# Altium footprint library Connectors_THT.PcbLib: 103 footprints (part 8 of 11)
Each footprint in its own frame and in the unit in brackets; x right, y up, seen from the top. Pads: shape width x height; smd on the part's side, far side on the other; paste and mask are expansions set on the pad; w line width, h text height; cw(c..) or ccw(c..) is an arc to the next point about the centre after c.
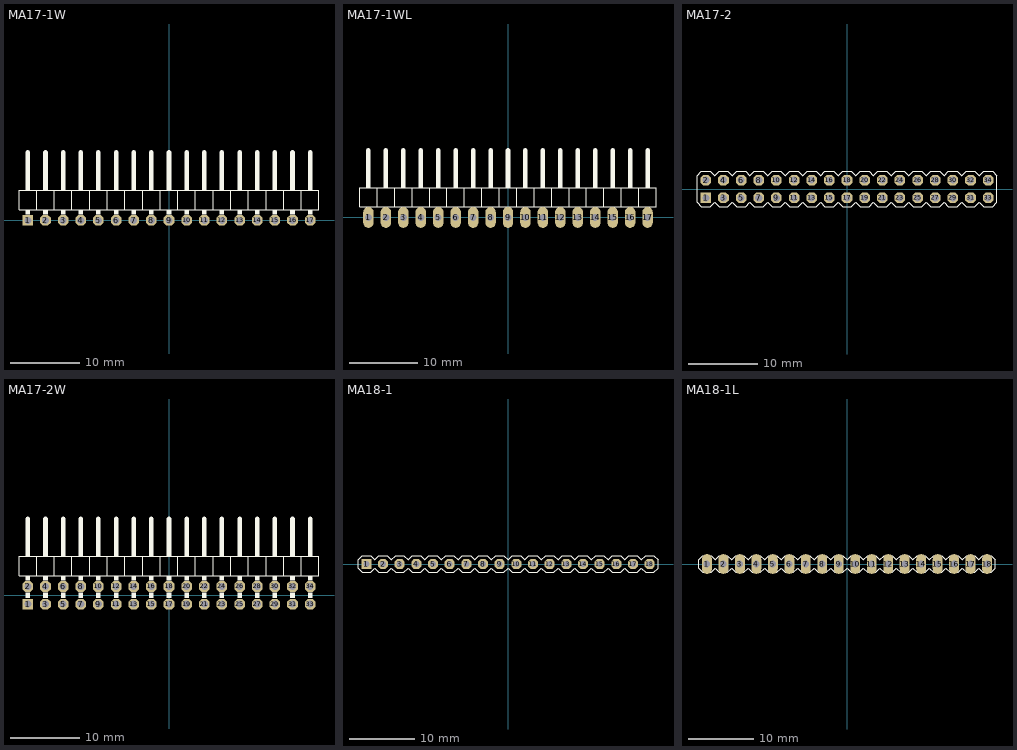
[diagram p7: the footprints below, top view; thin cyan lines are the x and y axes]

## MA17-1W [mil]
pads (17):
  rect 60x60 hole 40: 1(-800,0)
  oct 60x60 hole 40: 2(-700,0) 3(-600,0) 4(-500,0) 5(-400,0) 6(-300,0) 7(-200,0) 8(-100,0) 9(0,0) 10(100,0) 11(200,0) 12(300,0) 13(400,0) 14(500,0) 15(600,0) 16(700,0) 17(800,0)
Top Overlay:
  rectangle: 687,170 713,200
  rectangle: 787,170 813,200
  rectangle: 187,170 213,200
  rectangle: 287,170 313,200
  rectangle: 387,170 413,200
  rectangle: 487,170 513,200
  rectangle: 587,170 613,200
  rectangle: -313,170 -287,200
  rectangle: -213,170 -187,200
  rectangle: -113,170 -87,200
  rectangle: -13,170 13,200
  rectangle: 87,170 113,200
  rectangle: -813,170 -787,200
  rectangle: -713,170 -687,200
  rectangle: -613,170 -587,200
  rectangle: -513,170 -487,200
  rectangle: -413,170 -387,200
  rectangle: 787,34 813,60
  rectangle: 687,34 713,60
  rectangle: 587,34 613,60
  rectangle: 487,34 513,60
  rectangle: 387,34 413,60
  rectangle: 287,34 313,60
  rectangle: 187,34 213,60
  rectangle: 87,34 113,60
  rectangle: -13,34 13,60
  rectangle: -113,34 -87,60
  rectangle: -213,34 -187,60
  rectangle: -313,34 -287,60
  rectangle: -413,34 -387,60
  rectangle: -513,34 -487,60
  rectangle: -613,34 -587,60
  rectangle: -713,34 -687,60
  rectangle: -813,34 -787,60
  lines w6: -750,60 -750,170 ; -750,60 -850,60 -850,170 -750,170 ; -750,60 -650,60 ; -750,170 -650,170 ; -650,60 -550,60 ; -650,60 -650,170 ; -650,170 -550,170 ; -550,60 -450,60 ; -550,60 -550,170 ; -550,170 -450,170 ; -450,60 -350,60 ; -450,60 -450,170 ; -450,170 -350,170 ; -350,60 -250,60 ; -350,60 -350,170 ; -350,170 -250,170 ; -250,60 -250,170 ; -250,60 -150,60 ; -250,170 -150,170 ; -150,60 -50,60 ; -150,60 -150,170 ; -150,170 -50,170 ; -50,60 50,60 ; -50,60 -50,170 ; -50,170 50,170 ; 50,60 150,60 ; 50,60 50,170 ; 50,170 150,170 ; 150,60 250,60 ; 150,60 150,170 ; 150,170 250,170 ; 250,60 250,170 ; 250,60 350,60 ; 250,170 350,170 ; 350,60 450,60 ; 350,60 350,170 ; 350,170 450,170 ; 450,60 550,60 ; 450,60 450,170 ; 450,170 550,170 ; 550,60 650,60 ; 550,60 550,170 ; 550,170 650,170 ; 650,60 750,60 ; 650,60 650,170 ; 650,170 750,170 ; 750,60 750,170 ; 750,60 850,60 850,170 750,170
  lines w26: -800,200 -800,385 ; -700,200 -700,385 ; -600,200 -600,385 ; -500,200 -500,385 ; -400,200 -400,385 ; -300,200 -300,385 ; -200,200 -200,385 ; -100,200 -100,385 ; 0,200 0,385 ; 100,200 100,385 ; 200,200 200,385 ; 300,200 300,385 ; 400,200 400,385 ; 500,200 500,385 ; 600,200 600,385 ; 700,200 700,385 ; 800,200 800,385
3D body: height 62.48, standoff 0, extent 787.51,-12.49 812.51,12.51
3D body: height 100, standoff 0, extent 750,60 850,170
3D body: height 62.5, standoff 37.5, extent 787.51,-12.49 812.51,393.76
3D body: height 62.5, standoff 37.5, extent 687.5,-12.49 712.5,393.75
3D body: height 100, standoff 0, extent 650,60 750,170
3D body: height 62.48, standoff 0, extent 687.51,-12.49 712.51,12.51
3D body: height 31.5, standoff 0, extent 687.51,-12.49 712.51,12.51
3D body: height 31.5, standoff 0, extent 787.51,-12.49 812.51,12.51
3D body: height 62.48, standoff 0, extent 587.51,-12.49 612.51,12.51
3D body: height 100, standoff 0, extent 550,60 650,170
3D body: height 62.5, standoff 37.5, extent 587.51,-12.49 612.51,393.76
3D body: height 62.48, standoff 0, extent 487.51,-12.49 512.51,12.51
3D body: height 100, standoff 0, extent 450,60 550,170
3D body: height 62.5, standoff 37.5, extent 487.51,-12.49 512.51,393.76
3D body: height 62.48, standoff 0, extent 387.51,-12.49 412.51,12.51
3D body: height 100, standoff 0, extent 350,60 450,170
3D body: height 62.5, standoff 37.5, extent 387.51,-12.49 412.51,393.76
3D body: height 62.48, standoff 0, extent 287.51,-12.49 312.51,12.51
3D body: height 100, standoff 0, extent 250,60 350,170
3D body: height 62.5, standoff 37.5, extent 287.51,-12.49 312.51,393.76
3D body: height 62.5, standoff 37.5, extent 187.5,-12.49 212.5,393.75
3D body: height 100, standoff 0, extent 150,60 250,170
3D body: height 62.48, standoff 0, extent 187.51,-12.49 212.51,12.51
3D body: height 31.5, standoff 0, extent 187.51,-12.49 212.51,12.51
3D body: height 31.5, standoff 0, extent 287.51,-12.49 312.51,12.51
3D body: height 31.5, standoff 0, extent 387.51,-12.49 412.51,12.51
3D body: height 31.5, standoff 0, extent 487.51,-12.49 512.51,12.51
3D body: height 31.5, standoff 0, extent 587.51,-12.49 612.51,12.51
3D body: height 62.48, standoff 0, extent 87.51,-12.49 112.51,12.51
3D body: height 100, standoff 0, extent 50,60 150,170
3D body: height 62.5, standoff 37.5, extent 87.51,-12.49 112.51,393.76
3D body: height 62.48, standoff 0, extent -12.49,-12.49 12.51,12.51
3D body: height 100, standoff 0, extent -50,60 50,170
3D body: height 62.5, standoff 37.5, extent -12.49,-12.49 12.51,393.76
3D body: height 62.48, standoff 0, extent -112.49,-12.49 -87.49,12.51
3D body: height 100, standoff 0, extent -150,60 -50,170
3D body: height 62.5, standoff 37.5, extent -112.49,-12.49 -87.49,393.76
3D body: height 62.48, standoff 0, extent -212.49,-12.49 -187.49,12.51
3D body: height 100, standoff 0, extent -250,60 -150,170
3D body: height 62.5, standoff 37.5, extent -212.49,-12.49 -187.49,393.76
3D body: height 62.5, standoff 37.5, extent -312.5,-12.49 -287.5,393.75
3D body: height 100, standoff 0, extent -350,60 -250,170
3D body: height 62.48, standoff 0, extent -312.49,-12.49 -287.49,12.51
3D body: height 31.5, standoff 0, extent -312.49,-12.49 -287.49,12.51
3D body: height 31.5, standoff 0, extent -212.49,-12.49 -187.49,12.51
3D body: height 31.5, standoff 0, extent -112.49,-12.49 -87.49,12.51
3D body: height 31.5, standoff 0, extent -12.49,-12.49 12.51,12.51
3D body: height 31.5, standoff 0, extent 87.51,-12.49 112.51,12.51
3D body: height 62.48, standoff 0, extent -412.49,-12.49 -387.49,12.51
3D body: height 100, standoff 0, extent -450,60 -350,170
3D body: height 62.5, standoff 37.5, extent -412.49,-12.49 -387.49,393.76
3D body: height 62.48, standoff 0, extent -512.49,-12.49 -487.49,12.51
3D body: height 100, standoff 0, extent -550,60 -450,170
3D body: height 62.5, standoff 37.5, extent -512.49,-12.49 -487.49,393.76
3D body: height 62.48, standoff 0, extent -612.49,-12.49 -587.49,12.51
3D body: height 100, standoff 0, extent -650,60 -550,170
3D body: height 62.5, standoff 37.5, extent -612.49,-12.49 -587.49,393.76
3D body: height 62.48, standoff 0, extent -712.49,-12.49 -687.49,12.51
3D body: height 100, standoff 0, extent -750,60 -650,170
3D body: height 62.5, standoff 37.5, extent -712.49,-12.49 -687.49,393.76
3D body: height 62.5, standoff 37.5, extent -812.5,-12.49 -787.5,393.75
3D body: height 100, standoff 0, extent -850,60 -750,170
3D body: height 62.48, standoff 0, extent -812.49,-12.49 -787.49,12.51
3D body: height 31.5, standoff 0, extent -812.49,-12.49 -787.49,12.51
3D body: height 31.5, standoff 0, extent -712.49,-12.49 -687.49,12.51
3D body: height 31.5, standoff 0, extent -612.49,-12.49 -587.49,12.51
3D body: height 31.5, standoff 0, extent -512.49,-12.49 -487.49,12.51
3D body: height 31.5, standoff 0, extent -412.49,-12.49 -387.49,12.51

## MA17-1WL [mil]
pads (17):
  oval 60x120 hole 40: 1(-800,0) 2(-700,0) 3(-600,0) 4(-500,0) 5(-400,0) 6(-300,0) 7(-200,0) 8(-100,0) 9(0,0) 10(100,0) 11(200,0) 12(300,0) 13(400,0) 14(500,0) 15(600,0) 16(700,0) 17(800,0)
Top Overlay:
  rectangle: -813,34 -787,60
  rectangle: -713,34 -687,60
  rectangle: -613,34 -587,60
  rectangle: -513,34 -487,60
  rectangle: -413,34 -387,60
  rectangle: -313,34 -287,60
  rectangle: -213,34 -187,60
  rectangle: -113,34 -87,60
  rectangle: -13,34 13,60
  rectangle: 87,34 113,60
  rectangle: 187,34 213,60
  rectangle: 287,34 313,60
  rectangle: 387,34 413,60
  rectangle: 487,34 513,60
  rectangle: 587,34 613,60
  rectangle: 687,34 713,60
  rectangle: 787,34 813,60
  rectangle: -413,170 -387,200
  rectangle: -513,170 -487,200
  rectangle: -613,170 -587,200
  rectangle: -713,170 -687,200
  rectangle: -813,170 -787,200
  rectangle: 87,170 113,200
  rectangle: -13,170 13,200
  rectangle: -113,170 -87,200
  rectangle: -213,170 -187,200
  rectangle: -313,170 -287,200
  rectangle: 587,170 613,200
  rectangle: 487,170 513,200
  rectangle: 387,170 413,200
  rectangle: 287,170 313,200
  rectangle: 187,170 213,200
  rectangle: 787,170 813,200
  rectangle: 687,170 713,200
  lines w6: -750,60 -650,60 ; -750,60 -850,60 -850,170 -750,170 ; -750,60 -750,170 ; -750,170 -650,170 ; -650,60 -650,170 ; -650,60 -550,60 ; -650,170 -550,170 ; -550,60 -550,170 ; -550,60 -450,60 ; -550,170 -450,170 ; -450,60 -450,170 ; -450,60 -350,60 ; -450,170 -350,170 ; -350,60 -350,170 ; -350,60 -250,60 ; -350,170 -250,170 ; -250,60 -150,60 ; -250,60 -250,170 ; -250,170 -150,170 ; -150,60 -150,170 ; -150,60 -50,60 ; -150,170 -50,170 ; -50,60 -50,170 ; -50,60 50,60 ; -50,170 50,170 ; 50,60 50,170 ; 50,60 150,60 ; 50,170 150,170 ; 150,60 150,170 ; 150,60 250,60 ; 150,170 250,170 ; 250,60 350,60 ; 250,60 250,170 ; 250,170 350,170 ; 350,60 350,170 ; 350,60 450,60 ; 350,170 450,170 ; 450,60 450,170 ; 450,60 550,60 ; 450,170 550,170 ; 550,60 550,170 ; 550,60 650,60 ; 550,170 650,170 ; 650,60 650,170 ; 650,60 750,60 ; 650,170 750,170 ; 750,60 850,60 850,170 750,170 ; 750,60 750,170
  lines w26: -800,200 -800,385 ; -700,200 -700,385 ; -600,200 -600,385 ; -500,200 -500,385 ; -400,200 -400,385 ; -300,200 -300,385 ; -200,200 -200,385 ; -100,200 -100,385 ; 0,200 0,385 ; 100,200 100,385 ; 200,200 200,385 ; 300,200 300,385 ; 400,200 400,385 ; 500,200 500,385 ; 600,200 600,385 ; 700,200 700,385 ; 800,200 800,385
3D body: height 31.5, standoff 0, extent -412.49,-12.49 -387.49,12.51
3D body: height 31.5, standoff 0, extent -512.49,-12.49 -487.49,12.51
3D body: height 31.5, standoff 0, extent -612.49,-12.49 -587.49,12.51
3D body: height 31.5, standoff 0, extent -712.49,-12.49 -687.49,12.51
3D body: height 31.5, standoff 0, extent -812.49,-12.49 -787.49,12.51
3D body: height 62.48, standoff 0, extent -812.49,-12.49 -787.49,12.51
3D body: height 100, standoff 0, extent -850,60 -750,170
3D body: height 62.5, standoff 37.5, extent -812.5,-12.49 -787.5,393.75
3D body: height 62.5, standoff 37.5, extent -712.49,-12.49 -687.49,393.76
3D body: height 100, standoff 0, extent -750,60 -650,170
3D body: height 62.48, standoff 0, extent -712.49,-12.49 -687.49,12.51
3D body: height 62.5, standoff 37.5, extent -612.49,-12.49 -587.49,393.76
3D body: height 100, standoff 0, extent -650,60 -550,170
3D body: height 62.48, standoff 0, extent -612.49,-12.49 -587.49,12.51
3D body: height 62.5, standoff 37.5, extent -512.49,-12.49 -487.49,393.76
3D body: height 100, standoff 0, extent -550,60 -450,170
3D body: height 62.48, standoff 0, extent -512.49,-12.49 -487.49,12.51
3D body: height 62.5, standoff 37.5, extent -412.49,-12.49 -387.49,393.76
3D body: height 100, standoff 0, extent -450,60 -350,170
3D body: height 62.48, standoff 0, extent -412.49,-12.49 -387.49,12.51
3D body: height 31.5, standoff 0, extent 87.51,-12.49 112.51,12.51
3D body: height 31.5, standoff 0, extent -12.49,-12.49 12.51,12.51
3D body: height 31.5, standoff 0, extent -112.49,-12.49 -87.49,12.51
3D body: height 31.5, standoff 0, extent -212.49,-12.49 -187.49,12.51
3D body: height 31.5, standoff 0, extent -312.49,-12.49 -287.49,12.51
3D body: height 62.48, standoff 0, extent -312.49,-12.49 -287.49,12.51
3D body: height 100, standoff 0, extent -350,60 -250,170
3D body: height 62.5, standoff 37.5, extent -312.5,-12.49 -287.5,393.75
3D body: height 62.5, standoff 37.5, extent -212.49,-12.49 -187.49,393.76
3D body: height 100, standoff 0, extent -250,60 -150,170
3D body: height 62.48, standoff 0, extent -212.49,-12.49 -187.49,12.51
3D body: height 62.5, standoff 37.5, extent -112.49,-12.49 -87.49,393.76
3D body: height 100, standoff 0, extent -150,60 -50,170
3D body: height 62.48, standoff 0, extent -112.49,-12.49 -87.49,12.51
3D body: height 62.5, standoff 37.5, extent -12.49,-12.49 12.51,393.76
3D body: height 100, standoff 0, extent -50,60 50,170
3D body: height 62.48, standoff 0, extent -12.49,-12.49 12.51,12.51
3D body: height 62.5, standoff 37.5, extent 87.51,-12.49 112.51,393.76
3D body: height 100, standoff 0, extent 50,60 150,170
3D body: height 62.48, standoff 0, extent 87.51,-12.49 112.51,12.51
3D body: height 31.5, standoff 0, extent 587.51,-12.49 612.51,12.51
3D body: height 31.5, standoff 0, extent 487.51,-12.49 512.51,12.51
3D body: height 31.5, standoff 0, extent 387.51,-12.49 412.51,12.51
3D body: height 31.5, standoff 0, extent 287.51,-12.49 312.51,12.51
3D body: height 31.5, standoff 0, extent 187.51,-12.49 212.51,12.51
3D body: height 62.48, standoff 0, extent 187.51,-12.49 212.51,12.51
3D body: height 100, standoff 0, extent 150,60 250,170
3D body: height 62.5, standoff 37.5, extent 187.5,-12.49 212.5,393.75
3D body: height 62.5, standoff 37.5, extent 287.51,-12.49 312.51,393.76
3D body: height 100, standoff 0, extent 250,60 350,170
3D body: height 62.48, standoff 0, extent 287.51,-12.49 312.51,12.51
3D body: height 62.5, standoff 37.5, extent 387.51,-12.49 412.51,393.76
3D body: height 100, standoff 0, extent 350,60 450,170
3D body: height 62.48, standoff 0, extent 387.51,-12.49 412.51,12.51
3D body: height 62.5, standoff 37.5, extent 487.51,-12.49 512.51,393.76
3D body: height 100, standoff 0, extent 450,60 550,170
3D body: height 62.48, standoff 0, extent 487.51,-12.49 512.51,12.51
3D body: height 62.5, standoff 37.5, extent 587.51,-12.49 612.51,393.76
3D body: height 100, standoff 0, extent 550,60 650,170
3D body: height 62.48, standoff 0, extent 587.51,-12.49 612.51,12.51
3D body: height 31.5, standoff 0, extent 787.51,-12.49 812.51,12.51
3D body: height 31.5, standoff 0, extent 687.51,-12.49 712.51,12.51
3D body: height 62.48, standoff 0, extent 687.51,-12.49 712.51,12.51
3D body: height 100, standoff 0, extent 650,60 750,170
3D body: height 62.5, standoff 37.5, extent 687.5,-12.49 712.5,393.75
3D body: height 62.5, standoff 37.5, extent 787.51,-12.49 812.51,393.76
3D body: height 100, standoff 0, extent 750,60 850,170
3D body: height 62.48, standoff 0, extent 787.51,-12.49 812.51,12.51

## MA17-2 [mil]
pads (34):
  rect 60x60 hole 40: 1(-800,-50)
  oct 60x60 hole 40: 2(-800,50) 3(-700,-50) 4(-700,50) 5(-600,-50) 6(-600,50) 7(-500,-50) 8(-500,50) 9(-400,-50) 10(-400,50) 11(-300,-50) 12(-300,50) 13(-200,-50) 14(-200,50) 15(-100,-50) 16(-100,50) 17(0,-50) 18(0,50) 19(100,-50) 20(100,50) 21(200,-50) 22(200,50) 23(300,-50) 24(300,50) 25(400,-50) 26(400,50) 27(500,-50) 28(500,50) 29(600,-50) 30(600,50) 31(700,-50) 32(700,50) 33(800,-50) 34(800,50)
Top Overlay:
  lines w6: -850,-75 -825,-100 -775,-100 -750,-75 -725,-100 -675,-100 -650,-75 -625,-100 -575,-100 -550,-75 -525,-100 -475,-100 -450,-75 -425,-100 -375,-100 -350,-75 -325,-100 -275,-100 -250,-75 -225,-100 -175,-100 -150,-75 -125,-100 -75,-100 -50,-75 -25,-100 25,-100 50,-75 75,-100 125,-100 150,-75 175,-100 225,-100 250,-75 275,-100 325,-100 350,-75 375,-100 425,-100 450,-75 475,-100 525,-100 550,-75 575,-100 625,-100 650,-75 675,-100 725,-100 750,-75 775,-100 825,-100 850,-75 850,75 825,100 775,100 750,75 725,100 675,100 650,75 625,100 575,100 550,75 525,100 475,100 450,75 425,100 375,100 350,75 325,100 275,100 250,75 225,100 175,100 150,75 125,100 75,100 50,75 25,100 -25,100 -50,75 -75,100 -125,100 -150,75 -175,100 -225,100 -250,75 -275,100 -325,100 -350,75 -375,100 -425,100 -450,75 -475,100 -525,100 -550,75 -575,100 -625,100 -650,75 -675,100 -725,100 -750,75 -775,100 -825,100 -850,75 -850,-75
3D body: height 31.5, standoff 0, extent 587.51,-62.49 612.51,-37.49
3D body: height 338.58, standoff 0, extent 587.51,37.51 612.51,62.51
3D body: height 98.43, standoff 11.81, extent 550,-100 650,100
3D body: height 11.81, standoff 0, extent 550,75 650,100
3D body: height 11.81, standoff 0, extent 550,-100 650,-75
3D body: height 338.58, standoff 0, extent 587.51,-62.49 612.51,-37.49
3D body: height 31.5, standoff 0, extent 587.51,37.51 612.51,62.51
3D body: height 31.5, standoff 0, extent 687.51,-62.49 712.51,-37.49
3D body: height 338.58, standoff 0, extent 687.51,37.51 712.51,62.51
3D body: height 98.43, standoff 11.81, extent 650,-100 750,100
3D body: height 11.81, standoff 0, extent 650,75 750,100
3D body: height 11.81, standoff 0, extent 650,-100 750,-75
3D body: height 338.58, standoff 0, extent 687.51,-62.49 712.51,-37.49
3D body: height 31.5, standoff 0, extent 687.51,37.51 712.51,62.51
3D body: height 31.5, standoff 0, extent 787.51,-62.49 812.51,-37.49
3D body: height 338.58, standoff 0, extent 787.51,37.51 812.51,62.51
3D body: height 98.43, standoff 11.81, extent 750,-100 850,100
3D body: height 11.81, standoff 0, extent 750,75 850,100
3D body: height 11.81, standoff 0, extent 750,-100 850,-75
3D body: height 338.58, standoff 0, extent 787.51,-62.49 812.51,-37.49
3D body: height 31.5, standoff 0, extent 787.51,37.51 812.51,62.51
3D body: height 31.5, standoff 0, extent -112.49,-62.49 -87.49,-37.49
3D body: height 338.58, standoff 0, extent -112.49,37.51 -87.49,62.51
3D body: height 98.43, standoff 11.81, extent -150,-100 -50,100
3D body: height 11.81, standoff 0, extent -150,75 -50,100
3D body: height 11.81, standoff 0, extent -150,-100 -50,-75
3D body: height 338.58, standoff 0, extent -112.49,-62.49 -87.49,-37.49
3D body: height 31.5, standoff 0, extent -112.49,37.51 -87.49,62.51
3D body: height 31.5, standoff 0, extent -12.49,-62.49 12.51,-37.49
3D body: height 338.58, standoff 0, extent -12.49,37.51 12.51,62.51
3D body: height 98.43, standoff 11.81, extent -50,-100 50,100
3D body: height 11.81, standoff 0, extent -50,75 50,100
3D body: height 11.81, standoff 0, extent -50,-100 50,-75
3D body: height 338.58, standoff 0, extent -12.49,-62.49 12.51,-37.49
3D body: height 31.5, standoff 0, extent -12.49,37.51 12.51,62.51
3D body: height 31.5, standoff 0, extent 87.51,-62.49 112.51,-37.49
3D body: height 338.58, standoff 0, extent 87.51,37.51 112.51,62.51
3D body: height 98.43, standoff 11.81, extent 50,-100 150,100
3D body: height 11.81, standoff 0, extent 50,75 150,100
3D body: height 11.81, standoff 0, extent 50,-100 150,-75
3D body: height 338.58, standoff 0, extent 87.51,-62.49 112.51,-37.49
3D body: height 31.5, standoff 0, extent 87.51,37.51 112.51,62.51
3D body: height 31.5, standoff 0, extent 187.51,-62.49 212.51,-37.49
3D body: height 338.58, standoff 0, extent 187.51,37.51 212.51,62.51
3D body: height 98.43, standoff 11.81, extent 150,-100 250,100
3D body: height 11.81, standoff 0, extent 150,75 250,100
3D body: height 11.81, standoff 0, extent 150,-100 250,-75
3D body: height 338.58, standoff 0, extent 187.51,-62.49 212.51,-37.49
3D body: height 31.5, standoff 0, extent 187.51,37.51 212.51,62.51
3D body: height 31.5, standoff 0, extent 287.51,-62.49 312.51,-37.49
3D body: height 338.58, standoff 0, extent 287.51,37.51 312.51,62.51
3D body: height 98.43, standoff 11.81, extent 250,-100 350,100
3D body: height 11.81, standoff 0, extent 250,75 350,100
3D body: height 11.81, standoff 0, extent 250,-100 350,-75
3D body: height 338.58, standoff 0, extent 287.51,-62.49 312.51,-37.49
3D body: height 31.5, standoff 0, extent 287.51,37.51 312.51,62.51
3D body: height 31.5, standoff 0, extent 387.51,-62.49 412.51,-37.49
3D body: height 338.58, standoff 0, extent 387.51,37.51 412.51,62.51
3D body: height 98.43, standoff 11.81, extent 350,-100 450,100
3D body: height 11.81, standoff 0, extent 350,75 450,100
3D body: height 11.81, standoff 0, extent 350,-100 450,-75
3D body: height 338.58, standoff 0, extent 387.51,-62.49 412.51,-37.49
3D body: height 31.5, standoff 0, extent 387.51,37.51 412.51,62.51
3D body: height 31.5, standoff 0, extent 487.51,-62.49 512.51,-37.49
3D body: height 338.58, standoff 0, extent 487.51,37.51 512.51,62.51
3D body: height 98.43, standoff 11.81, extent 450,-100 550,100
3D body: height 11.81, standoff 0, extent 450,75 550,100
3D body: height 11.81, standoff 0, extent 450,-100 550,-75
3D body: height 338.58, standoff 0, extent 487.51,-62.49 512.51,-37.49
3D body: height 31.5, standoff 0, extent 487.51,37.51 512.51,62.51
3D body: height 31.5, standoff 0, extent -812.49,-62.49 -787.49,-37.49
3D body: height 338.58, standoff 0, extent -812.49,37.51 -787.49,62.51
3D body: height 98.43, standoff 11.81, extent -850,-100 -750,100
3D body: height 11.81, standoff 0, extent -850,75 -750,100
3D body: height 11.81, standoff 0, extent -850,-100 -750,-75
3D body: height 338.58, standoff 0, extent -812.49,-62.49 -787.49,-37.49
3D body: height 31.5, standoff 0, extent -812.49,37.51 -787.49,62.51
3D body: height 31.5, standoff 0, extent -712.49,-62.49 -687.49,-37.49
3D body: height 338.58, standoff 0, extent -712.49,37.51 -687.49,62.51
3D body: height 98.43, standoff 11.81, extent -750,-100 -650,100
3D body: height 11.81, standoff 0, extent -750,75 -650,100
3D body: height 11.81, standoff 0, extent -750,-100 -650,-75
3D body: height 338.58, standoff 0, extent -712.49,-62.49 -687.49,-37.49
3D body: height 31.5, standoff 0, extent -712.49,37.51 -687.49,62.51
3D body: height 31.5, standoff 0, extent -612.49,-62.49 -587.49,-37.49
3D body: height 338.58, standoff 0, extent -612.49,37.51 -587.49,62.51
3D body: height 98.43, standoff 11.81, extent -650,-100 -550,100
3D body: height 11.81, standoff 0, extent -650,75 -550,100
3D body: height 11.81, standoff 0, extent -650,-100 -550,-75
3D body: height 338.58, standoff 0, extent -612.49,-62.49 -587.49,-37.49
3D body: height 31.5, standoff 0, extent -612.49,37.51 -587.49,62.51
3D body: height 31.5, standoff 0, extent -512.49,-62.49 -487.49,-37.49
3D body: height 338.58, standoff 0, extent -512.49,37.51 -487.49,62.51
3D body: height 98.43, standoff 11.81, extent -550,-100 -450,100
3D body: height 11.81, standoff 0, extent -550,75 -450,100
3D body: height 11.81, standoff 0, extent -550,-100 -450,-75
3D body: height 338.58, standoff 0, extent -512.49,-62.49 -487.49,-37.49
3D body: height 31.5, standoff 0, extent -512.49,37.51 -487.49,62.51
3D body: height 31.5, standoff 0, extent -412.49,-62.49 -387.49,-37.49
3D body: height 338.58, standoff 0, extent -412.49,37.51 -387.49,62.51
3D body: height 98.43, standoff 11.81, extent -450,-100 -350,100
3D body: height 11.81, standoff 0, extent -450,75 -350,100
3D body: height 11.81, standoff 0, extent -450,-100 -350,-75
3D body: height 338.58, standoff 0, extent -412.49,-62.49 -387.49,-37.49
3D body: height 31.5, standoff 0, extent -412.49,37.51 -387.49,62.51
3D body: height 31.5, standoff 0, extent -312.49,-62.49 -287.49,-37.49
3D body: height 338.58, standoff 0, extent -312.49,37.51 -287.49,62.51
3D body: height 98.43, standoff 11.81, extent -350,-100 -250,100
3D body: height 11.81, standoff 0, extent -350,75 -250,100
3D body: height 11.81, standoff 0, extent -350,-100 -250,-75
3D body: height 338.58, standoff 0, extent -312.49,-62.49 -287.49,-37.49
3D body: height 31.5, standoff 0, extent -312.49,37.51 -287.49,62.51
3D body: height 31.5, standoff 0, extent -212.49,-62.49 -187.49,-37.49
3D body: height 338.58, standoff 0, extent -212.49,37.51 -187.49,62.51
3D body: height 98.43, standoff 11.81, extent -250,-100 -150,100
3D body: height 11.81, standoff 0, extent -250,75 -150,100
3D body: height 11.81, standoff 0, extent -250,-100 -150,-75
3D body: height 338.58, standoff 0, extent -212.49,-62.49 -187.49,-37.49
3D body: height 31.5, standoff 0, extent -212.49,37.51 -187.49,62.51

## MA17-2W [mil]
pads (34):
  rect 60x60 hole 40: 1(-800,-50)
  oct 60x60 hole 40: 2(-800,50) 3(-700,-50) 4(-700,50) 5(-600,-50) 6(-600,50) 7(-500,-50) 8(-500,50) 9(-400,-50) 10(-400,50) 11(-300,-50) 12(-300,50) 13(-200,-50) 14(-200,50) 15(-100,-50) 16(-100,50) 17(0,-50) 18(0,50) 19(100,-50) 20(100,50) 21(200,-50) 22(200,50) 23(300,-50) 24(300,50) 25(400,-50) 26(400,50) 27(500,-50) 28(500,50) 29(600,-50) 30(600,50) 31(700,-50) 32(700,50) 33(800,-50) 34(800,50)
Top Overlay:
  rectangle: 687,220 713,250
  rectangle: 787,220 813,250
  rectangle: 187,220 213,250
  rectangle: 287,220 313,250
  rectangle: 387,220 413,250
  rectangle: 487,220 513,250
  rectangle: 587,220 613,250
  rectangle: -313,220 -287,250
  rectangle: -213,220 -187,250
  rectangle: -113,220 -87,250
  rectangle: -13,220 13,250
  rectangle: 87,220 113,250
  rectangle: -813,220 -787,250
  rectangle: -713,220 -687,250
  rectangle: -613,220 -587,250
  rectangle: -513,220 -487,250
  rectangle: -413,220 -387,250
  rectangle: 787,84 813,110
  rectangle: 687,84 713,110
  rectangle: 587,84 613,110
  rectangle: 487,84 513,110
  rectangle: 387,84 413,110
  rectangle: 287,84 313,110
  rectangle: 187,84 213,110
  rectangle: 87,84 113,110
  rectangle: -13,84 13,110
  rectangle: -113,84 -87,110
  rectangle: -213,84 -187,110
  rectangle: -313,84 -287,110
  rectangle: -413,84 -387,110
  rectangle: -513,84 -487,110
  rectangle: -613,84 -587,110
  rectangle: -713,84 -687,110
  rectangle: -813,84 -787,110
  rectangle: -813,-16 -787,16
  rectangle: -713,-16 -687,16
  rectangle: -613,-16 -587,16
  rectangle: -513,-16 -487,16
  rectangle: -413,-16 -387,16
  rectangle: -313,-16 -287,16
  rectangle: -213,-16 -187,16
  rectangle: -113,-16 -87,16
  rectangle: -13,-16 13,16
  rectangle: 87,-16 113,16
  rectangle: 187,-16 213,16
  rectangle: 287,-16 313,16
  rectangle: 387,-16 413,16
  rectangle: 487,-16 513,16
  rectangle: 587,-16 613,16
  rectangle: 687,-16 713,16
  rectangle: 787,-16 813,16
  lines w6: -750,110 -750,220 ; -750,110 -850,110 -850,220 -750,220 ; -750,110 -650,110 ; -750,220 -650,220 ; -650,110 -550,110 ; -650,110 -650,220 ; -650,220 -550,220 ; -550,110 -450,110 ; -550,110 -550,220 ; -550,220 -450,220 ; -450,110 -350,110 ; -450,110 -450,220 ; -450,220 -350,220 ; -350,110 -250,110 ; -350,110 -350,220 ; -350,220 -250,220 ; -250,110 -250,220 ; -250,110 -150,110 ; -250,220 -150,220 ; -150,110 -50,110 ; -150,110 -150,220 ; -150,220 -50,220 ; -50,110 50,110 ; -50,110 -50,220 ; -50,220 50,220 ; 50,110 150,110 ; 50,110 50,220 ; 50,220 150,220 ; 150,110 250,110 ; 150,110 150,220 ; 150,220 250,220 ; 250,110 250,220 ; 250,110 350,110 ; 250,220 350,220 ; 350,110 450,110 ; 350,110 350,220 ; 350,220 450,220 ; 450,110 550,110 ; 450,110 450,220 ; 450,220 550,220 ; 550,110 650,110 ; 550,110 550,220 ; 550,220 650,220 ; 650,110 750,110 ; 650,110 650,220 ; 650,220 750,220 ; 750,110 750,220 ; 750,110 850,110 850,220 750,220
  lines w26: -800,250 -800,435 ; -700,250 -700,435 ; -600,250 -600,435 ; -500,250 -500,435 ; -400,250 -400,435 ; -300,250 -300,435 ; -200,250 -200,435 ; -100,250 -100,435 ; 0,250 0,435 ; 100,250 100,435 ; 200,250 200,435 ; 300,250 300,435 ; 400,250 400,435 ; 500,250 500,435 ; 600,250 600,435 ; 700,250 700,435 ; 800,250 800,435
3D body: height 162.48, standoff 137.52, extent 787.5,-62.49 812.5,443.76
3D body: height 162.48, standoff 0, extent 787.51,-62.49 812.51,-37.49
3D body: height 62.48, standoff 0, extent 787.51,37.51 812.51,62.51
3D body: height 200, standoff 0, extent 750,110 850,220
3D body: height 62.5, standoff 37.5, extent 787.51,37.51 812.51,443.76
3D body: height 62.5, standoff 37.5, extent 687.5,37.51 712.5,443.75
3D body: height 200, standoff 0, extent 650,110 750,220
3D body: height 62.48, standoff 0, extent 687.51,37.51 712.51,62.51
3D body: height 162.48, standoff 0, extent 687.5,-62.5 712.5,-37.5
3D body: height 162.48, standoff 137.52, extent 687.5,-62.5 712.5,443.75
3D body: height 31.5, standoff 0, extent 687.51,37.5 712.51,62.5
3D body: height 31.5, standoff 0, extent 687.5,-62.5 712.5,-37.5
3D body: height 31.5, standoff 0, extent 787.51,37.51 812.51,62.51
3D body: height 31.5, standoff 0, extent 787.51,-62.49 812.51,-37.49
3D body: height 162.48, standoff 137.52, extent 587.5,-62.49 612.5,443.76
3D body: height 162.48, standoff 0, extent 587.51,-62.49 612.51,-37.49
3D body: height 62.48, standoff 0, extent 587.51,37.51 612.51,62.51
3D body: height 200, standoff 0, extent 550,110 650,220
3D body: height 62.5, standoff 37.5, extent 587.51,37.51 612.51,443.76
3D body: height 162.48, standoff 137.52, extent 487.5,-62.49 512.5,443.76
3D body: height 162.48, standoff 0, extent 487.51,-62.49 512.51,-37.49
3D body: height 62.48, standoff 0, extent 487.51,37.51 512.51,62.51
3D body: height 200, standoff 0, extent 450,110 550,220
3D body: height 62.5, standoff 37.5, extent 487.51,37.51 512.51,443.76
3D body: height 162.48, standoff 137.52, extent 387.5,-62.49 412.5,443.76
3D body: height 162.48, standoff 0, extent 387.51,-62.49 412.51,-37.49
3D body: height 62.48, standoff 0, extent 387.51,37.51 412.51,62.51
3D body: height 200, standoff 0, extent 350,110 450,220
3D body: height 62.5, standoff 37.5, extent 387.51,37.51 412.51,443.76
3D body: height 162.48, standoff 137.52, extent 287.5,-62.49 312.5,443.76
3D body: height 162.48, standoff 0, extent 287.51,-62.49 312.51,-37.49
3D body: height 62.48, standoff 0, extent 287.51,37.51 312.51,62.51
3D body: height 200, standoff 0, extent 250,110 350,220
3D body: height 62.5, standoff 37.5, extent 287.51,37.51 312.51,443.76
3D body: height 62.5, standoff 37.5, extent 187.5,37.51 212.5,443.75
3D body: height 200, standoff 0, extent 150,110 250,220
3D body: height 62.48, standoff 0, extent 187.51,37.51 212.51,62.51
3D body: height 162.48, standoff 0, extent 187.5,-62.5 212.5,-37.5
3D body: height 162.48, standoff 137.52, extent 187.5,-62.5 212.5,443.75
3D body: height 31.5, standoff 0, extent 187.51,37.5 212.51,62.5
3D body: height 31.5, standoff 0, extent 187.5,-62.5 212.5,-37.5
3D body: height 31.5, standoff 0, extent 287.51,37.51 312.51,62.51
3D body: height 31.5, standoff 0, extent 287.51,-62.49 312.51,-37.49
3D body: height 31.5, standoff 0, extent 387.51,-62.49 412.51,-37.49
3D body: height 31.5, standoff 0, extent 387.51,37.51 412.51,62.51
3D body: height 31.5, standoff 0, extent 487.51,37.51 512.51,62.51
3D body: height 31.5, standoff 0, extent 487.51,-62.49 512.51,-37.49
3D body: height 31.5, standoff 0, extent 587.51,37.51 612.51,62.51
3D body: height 31.5, standoff 0, extent 587.51,-62.49 612.51,-37.49
3D body: height 162.48, standoff 137.52, extent 87.5,-62.49 112.5,443.76
3D body: height 162.48, standoff 0, extent 87.51,-62.49 112.51,-37.49
3D body: height 62.48, standoff 0, extent 87.51,37.51 112.51,62.51
3D body: height 200, standoff 0, extent 50,110 150,220
3D body: height 62.5, standoff 37.5, extent 87.51,37.51 112.51,443.76
3D body: height 162.48, standoff 137.52, extent -12.5,-62.49 12.5,443.76
3D body: height 162.48, standoff 0, extent -12.49,-62.49 12.51,-37.49
3D body: height 62.48, standoff 0, extent -12.49,37.51 12.51,62.51
3D body: height 200, standoff 0, extent -50,110 50,220
3D body: height 62.5, standoff 37.5, extent -12.49,37.51 12.51,443.76
3D body: height 162.48, standoff 137.52, extent -112.5,-62.49 -87.5,443.76
3D body: height 162.48, standoff 0, extent -112.49,-62.49 -87.49,-37.49
3D body: height 62.48, standoff 0, extent -112.49,37.51 -87.49,62.51
3D body: height 200, standoff 0, extent -150,110 -50,220
3D body: height 62.5, standoff 37.5, extent -112.49,37.51 -87.49,443.76
3D body: height 162.48, standoff 137.52, extent -212.5,-62.49 -187.5,443.76
3D body: height 162.48, standoff 0, extent -212.49,-62.49 -187.49,-37.49
3D body: height 62.48, standoff 0, extent -212.49,37.51 -187.49,62.51
3D body: height 200, standoff 0, extent -250,110 -150,220
3D body: height 62.5, standoff 37.5, extent -212.49,37.51 -187.49,443.76
3D body: height 62.5, standoff 37.5, extent -312.5,37.51 -287.5,443.75
3D body: height 200, standoff 0, extent -350,110 -250,220
3D body: height 62.48, standoff 0, extent -312.49,37.51 -287.49,62.51
3D body: height 162.48, standoff 0, extent -312.5,-62.5 -287.5,-37.5
3D body: height 162.48, standoff 137.52, extent -312.5,-62.5 -287.5,443.75
3D body: height 31.5, standoff 0, extent -312.49,37.5 -287.49,62.5
3D body: height 31.5, standoff 0, extent -312.5,-62.5 -287.5,-37.5
3D body: height 31.5, standoff 0, extent -212.49,37.51 -187.49,62.51
3D body: height 31.5, standoff 0, extent -212.49,-62.49 -187.49,-37.49
3D body: height 31.5, standoff 0, extent -112.49,-62.49 -87.49,-37.49
3D body: height 31.5, standoff 0, extent -112.49,37.51 -87.49,62.51
3D body: height 31.5, standoff 0, extent -12.49,37.51 12.51,62.51
3D body: height 31.5, standoff 0, extent -12.49,-62.49 12.51,-37.49
3D body: height 31.5, standoff 0, extent 87.51,37.51 112.51,62.51
3D body: height 31.5, standoff 0, extent 87.51,-62.49 112.51,-37.49
3D body: height 162.48, standoff 137.52, extent -412.5,-62.49 -387.5,443.76
3D body: height 162.48, standoff 0, extent -412.49,-62.49 -387.49,-37.49
3D body: height 62.48, standoff 0, extent -412.49,37.51 -387.49,62.51
3D body: height 200, standoff 0, extent -450,110 -350,220
3D body: height 62.5, standoff 37.5, extent -412.49,37.51 -387.49,443.76
3D body: height 162.48, standoff 137.52, extent -512.5,-62.49 -487.5,443.76
3D body: height 162.48, standoff 0, extent -512.49,-62.49 -487.49,-37.49
3D body: height 62.48, standoff 0, extent -512.49,37.51 -487.49,62.51
3D body: height 200, standoff 0, extent -550,110 -450,220
3D body: height 62.5, standoff 37.5, extent -512.49,37.51 -487.49,443.76
3D body: height 162.48, standoff 137.52, extent -612.5,-62.49 -587.5,443.76
3D body: height 162.48, standoff 0, extent -612.49,-62.49 -587.49,-37.49
3D body: height 62.48, standoff 0, extent -612.49,37.51 -587.49,62.51
3D body: height 200, standoff 0, extent -650,110 -550,220
3D body: height 62.5, standoff 37.5, extent -612.49,37.51 -587.49,443.76
3D body: height 162.48, standoff 137.52, extent -712.5,-62.49 -687.5,443.76
3D body: height 162.48, standoff 0, extent -712.49,-62.49 -687.49,-37.49
3D body: height 62.48, standoff 0, extent -712.49,37.51 -687.49,62.51
3D body: height 200, standoff 0, extent -750,110 -650,220
3D body: height 62.5, standoff 37.5, extent -712.49,37.51 -687.49,443.76
3D body: height 62.5, standoff 37.5, extent -812.5,37.51 -787.5,443.75
3D body: height 200, standoff 0, extent -850,110 -750,220
3D body: height 62.48, standoff 0, extent -812.49,37.51 -787.49,62.51
3D body: height 162.48, standoff 0, extent -812.5,-62.5 -787.5,-37.5
3D body: height 162.48, standoff 137.52, extent -812.5,-62.5 -787.5,443.75
3D body: height 31.5, standoff 0, extent -812.49,37.5 -787.49,62.5
3D body: height 31.5, standoff 0, extent -812.5,-62.5 -787.5,-37.5
3D body: height 31.5, standoff 0, extent -712.49,37.51 -687.49,62.51
3D body: height 31.5, standoff 0, extent -712.49,-62.49 -687.49,-37.49
3D body: height 31.5, standoff 0, extent -612.49,-62.49 -587.49,-37.49
3D body: height 31.5, standoff 0, extent -612.49,37.51 -587.49,62.51
3D body: height 31.5, standoff 0, extent -512.49,37.51 -487.49,62.51
3D body: height 31.5, standoff 0, extent -512.49,-62.49 -487.49,-37.49
3D body: height 31.5, standoff 0, extent -412.49,37.51 -387.49,62.51
3D body: height 31.5, standoff 0, extent -412.49,-62.49 -387.49,-37.49

## MA18-1 [mil]
pads (18):
  rect 60x60 hole 36: 1(-850,0)
  oct 60x60 hole 36: 2(-750,0) 3(-650,0) 4(-550,0) 5(-450,0) 6(-350,0) 7(-250,0) 8(-150,0) 9(-50,0) 10(50,0) 11(150,0) 12(250,0) 13(350,0) 14(450,0) 15(550,0) 16(650,0) 17(750,0) 18(850,0)
Top Overlay:
  lines w6: -900,-25 -900,25 -875,50 -825,50 -800,25 -775,50 -725,50 -700,25 -675,50 -625,50 -600,25 -575,50 -525,50 -500,25 -475,50 -425,50 -400,25 -375,50 -325,50 -300,25 -275,50 -225,50 -200,25 -175,50 -125,50 -100,25 -75,50 -25,50 0,25 25,50 75,50 100,25 125,50 175,50 200,25 225,50 275,50 300,25 325,50 375,50 400,25 425,50 475,50 500,25 525,50 575,50 600,25 625,50 675,50 700,25 725,50 775,50 800,25 825,50 875,50 900,25 900,-25 875,-50 825,-50 800,-25 775,-50 725,-50 700,-25 675,-50 625,-50 600,-25 575,-50 525,-50 500,-25 475,-50 425,-50 400,-25 375,-50 325,-50 300,-25 275,-50 225,-50 200,-25 175,-50 125,-50 100,-25 75,-50 25,-50 0,-25 -25,-50 -75,-50 -100,-25 -125,-50 -175,-50 -200,-25 -225,-50 -275,-50 -300,-25 -325,-50 -375,-50 -400,-25 -425,-50 -475,-50 -500,-25 -525,-50 -575,-50 -600,-25 -625,-50 -675,-50 -700,-25 -725,-50 -775,-50 -800,-25 -825,-50 -875,-50 -900,-25
3D body: height 338.58, standoff 0, extent 837.5,-12.5 862.5,12.5
3D body: height 98.43, standoff 11.81, extent 800,-50 900,50
3D body: height 11.81, standoff 0, extent 800,-50 900,-25
3D body: height 11.81, standoff 0, extent 800,25 900,50
3D body: height 31.5, standoff 0, extent 837.5,-12.5 862.5,12.5
3D body: height 338.58, standoff 0, extent 737.5,-12.5 762.5,12.5
3D body: height 98.43, standoff 11.81, extent 700,-50 800,50
3D body: height 11.81, standoff 0, extent 700,-50 800,-25
3D body: height 11.81, standoff 0, extent 700,25 800,50
3D body: height 31.5, standoff 0, extent 737.5,-12.5 762.5,12.5
3D body: height 338.58, standoff 0, extent 637.5,-12.5 662.5,12.5
3D body: height 98.43, standoff 11.81, extent 600,-50 700,50
3D body: height 11.81, standoff 0, extent 600,-50 700,-25
3D body: height 11.81, standoff 0, extent 600,25 700,50
3D body: height 31.5, standoff 0, extent 637.5,-12.5 662.5,12.5
3D body: height 338.58, standoff 0, extent 537.5,-12.5 562.5,12.5
3D body: height 98.43, standoff 11.81, extent 500,-50 600,50
3D body: height 11.81, standoff 0, extent 500,-50 600,-25
3D body: height 11.81, standoff 0, extent 500,25 600,50
3D body: height 31.5, standoff 0, extent 537.5,-12.5 562.5,12.5
3D body: height 338.58, standoff 0, extent 437.5,-12.5 462.5,12.5
3D body: height 98.43, standoff 11.81, extent 400,-50 500,50
3D body: height 11.81, standoff 0, extent 400,-50 500,-25
3D body: height 11.81, standoff 0, extent 400,25 500,50
3D body: height 31.5, standoff 0, extent 437.5,-12.5 462.5,12.5
3D body: height 31.5, standoff 0, extent -862.5,-12.5 -837.5,12.5
3D body: height 11.81, standoff 0, extent -900,25 -800,50
3D body: height 11.81, standoff 0, extent -900,-50 -800,-25
3D body: height 98.43, standoff 11.81, extent -900,-50 -800,50
3D body: height 338.58, standoff 0, extent -862.5,-12.5 -837.5,12.5
3D body: height 31.5, standoff 0, extent -762.5,-12.5 -737.5,12.5
3D body: height 11.81, standoff 0, extent -800,25 -700,50
3D body: height 11.81, standoff 0, extent -800,-50 -700,-25
3D body: height 98.43, standoff 11.81, extent -800,-50 -700,50
3D body: height 338.58, standoff 0, extent -762.5,-12.5 -737.5,12.5
3D body: height 31.5, standoff 0, extent -662.5,-12.5 -637.5,12.5
3D body: height 11.81, standoff 0, extent -700,25 -600,50
3D body: height 11.81, standoff 0, extent -700,-50 -600,-25
3D body: height 98.43, standoff 11.81, extent -700,-50 -600,50
3D body: height 338.58, standoff 0, extent -662.5,-12.5 -637.5,12.5
3D body: height 31.5, standoff 0, extent -562.5,-12.5 -537.5,12.5
3D body: height 11.81, standoff 0, extent -600,25 -500,50
3D body: height 11.81, standoff 0, extent -600,-50 -500,-25
3D body: height 98.43, standoff 11.81, extent -600,-50 -500,50
3D body: height 338.58, standoff 0, extent -562.5,-12.5 -537.5,12.5
3D body: height 31.5, standoff 0, extent -462.5,-12.5 -437.5,12.5
3D body: height 11.81, standoff 0, extent -500,25 -400,50
3D body: height 11.81, standoff 0, extent -500,-50 -400,-25
3D body: height 98.43, standoff 11.81, extent -500,-50 -400,50
3D body: height 338.58, standoff 0, extent -462.5,-12.5 -437.5,12.5
3D body: height 31.5, standoff 0, extent -362.5,-12.5 -337.5,12.5
3D body: height 11.81, standoff 0, extent -400,25 -300,50
3D body: height 11.81, standoff 0, extent -400,-50 -300,-25
3D body: height 98.43, standoff 11.81, extent -400,-50 -300,50
3D body: height 338.58, standoff 0, extent -362.5,-12.5 -337.5,12.5
3D body: height 31.5, standoff 0, extent -262.5,-12.5 -237.5,12.5
3D body: height 11.81, standoff 0, extent -300,25 -200,50
3D body: height 11.81, standoff 0, extent -300,-50 -200,-25
3D body: height 98.43, standoff 11.81, extent -300,-50 -200,50
3D body: height 338.58, standoff 0, extent -262.5,-12.5 -237.5,12.5
3D body: height 31.5, standoff 0, extent -162.5,-12.5 -137.5,12.5
3D body: height 11.81, standoff 0, extent -200,25 -100,50
3D body: height 11.81, standoff 0, extent -200,-50 -100,-25
3D body: height 98.43, standoff 11.81, extent -200,-50 -100,50
3D body: height 338.58, standoff 0, extent -162.5,-12.5 -137.5,12.5
3D body: height 31.5, standoff 0, extent -62.5,-12.5 -37.5,12.5
3D body: height 11.81, standoff 0, extent -100,25 0,50
3D body: height 11.81, standoff 0, extent -100,-50 0,-25
3D body: height 98.43, standoff 11.81, extent -100,-50 0,50
3D body: height 338.58, standoff 0, extent -62.5,-12.5 -37.5,12.5
3D body: height 31.5, standoff 0, extent 37.5,-12.5 62.5,12.5
3D body: height 11.81, standoff 0, extent 0,25 100,50
3D body: height 11.81, standoff 0, extent 0,-50 100,-25
3D body: height 98.43, standoff 11.81, extent 0,-50 100,50
3D body: height 338.58, standoff 0, extent 37.5,-12.5 62.5,12.5
3D body: height 31.5, standoff 0, extent 137.5,-12.5 162.5,12.5
3D body: height 11.81, standoff 0, extent 100,25 200,50
3D body: height 11.81, standoff 0, extent 100,-50 200,-25
3D body: height 98.43, standoff 11.81, extent 100,-50 200,50
3D body: height 338.58, standoff 0, extent 137.5,-12.5 162.5,12.5
3D body: height 31.5, standoff 0, extent 237.5,-12.5 262.5,12.5
3D body: height 11.81, standoff 0, extent 200,25 300,50
3D body: height 11.81, standoff 0, extent 200,-50 300,-25
3D body: height 98.43, standoff 11.81, extent 200,-50 300,50
3D body: height 338.58, standoff 0, extent 237.5,-12.5 262.5,12.5
3D body: height 338.58, standoff 0, extent 337.5,-12.5 362.5,12.5
3D body: height 98.43, standoff 11.81, extent 300,-50 400,50
3D body: height 11.81, standoff 0, extent 300,-50 400,-25
3D body: height 11.81, standoff 0, extent 300,25 400,50
3D body: height 31.5, standoff 0, extent 337.5,-12.5 362.5,12.5

## MA18-1L [mil]
pads (18):
  oval 60x120 hole 40: 1(-850,0) 2(-750,0) 3(-650,0) 4(-550,0) 5(-450,0) 6(-350,0) 7(-250,0) 8(-150,0) 9(-50,0) 10(50,0) 11(150,0) 12(250,0) 13(350,0) 14(450,0) 15(550,0) 16(650,0) 17(750,0) 18(850,0)
Top Overlay:
  lines w6: -900,-25 -900,25 -875,50 -825,50 -800,25 -775,50 -725,50 -700,25 -675,50 -625,50 -600,25 -575,50 -525,50 -500,25 -475,50 -425,50 -400,25 -375,50 -325,50 -300,25 -275,50 -225,50 -200,25 -175,50 -125,50 -100,25 -75,50 -25,50 0,25 25,50 75,50 100,25 125,50 175,50 200,25 225,50 275,50 300,25 325,50 375,50 400,25 425,50 475,50 500,25 525,50 575,50 600,25 625,50 675,50 700,25 725,50 775,50 800,25 825,50 875,50 900,25 900,-25 875,-50 825,-50 800,-25 775,-50 725,-50 700,-25 675,-50 625,-50 600,-25 575,-50 525,-50 500,-25 475,-50 425,-50 400,-25 375,-50 325,-50 300,-25 275,-50 225,-50 200,-25 175,-50 125,-50 100,-25 75,-50 25,-50 0,-25 -25,-50 -75,-50 -100,-25 -125,-50 -175,-50 -200,-25 -225,-50 -275,-50 -300,-25 -325,-50 -375,-50 -400,-25 -425,-50 -475,-50 -500,-25 -525,-50 -575,-50 -600,-25 -625,-50 -675,-50 -700,-25 -725,-50 -775,-50 -800,-25 -825,-50 -875,-50 -900,-25
3D body: height 31.5, standoff 0, extent 337.5,-12.5 362.5,12.5
3D body: height 11.81, standoff 0, extent 300,25 400,50
3D body: height 11.81, standoff 0, extent 300,-50 400,-25
3D body: height 98.43, standoff 11.81, extent 300,-50 400,50
3D body: height 338.58, standoff 0, extent 337.5,-12.5 362.5,12.5
3D body: height 338.58, standoff 0, extent 237.5,-12.5 262.5,12.5
3D body: height 98.43, standoff 11.81, extent 200,-50 300,50
3D body: height 11.81, standoff 0, extent 200,-50 300,-25
3D body: height 11.81, standoff 0, extent 200,25 300,50
3D body: height 31.5, standoff 0, extent 237.5,-12.5 262.5,12.5
3D body: height 338.58, standoff 0, extent 137.5,-12.5 162.5,12.5
3D body: height 98.43, standoff 11.81, extent 100,-50 200,50
3D body: height 11.81, standoff 0, extent 100,-50 200,-25
3D body: height 11.81, standoff 0, extent 100,25 200,50
3D body: height 31.5, standoff 0, extent 137.5,-12.5 162.5,12.5
3D body: height 338.58, standoff 0, extent 37.5,-12.5 62.5,12.5
3D body: height 98.43, standoff 11.81, extent 0,-50 100,50
3D body: height 11.81, standoff 0, extent 0,-50 100,-25
3D body: height 11.81, standoff 0, extent 0,25 100,50
3D body: height 31.5, standoff 0, extent 37.5,-12.5 62.5,12.5
3D body: height 338.58, standoff 0, extent -62.5,-12.5 -37.5,12.5
3D body: height 98.43, standoff 11.81, extent -100,-50 0,50
3D body: height 11.81, standoff 0, extent -100,-50 0,-25
3D body: height 11.81, standoff 0, extent -100,25 0,50
3D body: height 31.5, standoff 0, extent -62.5,-12.5 -37.5,12.5
3D body: height 338.58, standoff 0, extent -162.5,-12.5 -137.5,12.5
3D body: height 98.43, standoff 11.81, extent -200,-50 -100,50
3D body: height 11.81, standoff 0, extent -200,-50 -100,-25
3D body: height 11.81, standoff 0, extent -200,25 -100,50
3D body: height 31.5, standoff 0, extent -162.5,-12.5 -137.5,12.5
3D body: height 338.58, standoff 0, extent -262.5,-12.5 -237.5,12.5
3D body: height 98.43, standoff 11.81, extent -300,-50 -200,50
3D body: height 11.81, standoff 0, extent -300,-50 -200,-25
3D body: height 11.81, standoff 0, extent -300,25 -200,50
3D body: height 31.5, standoff 0, extent -262.5,-12.5 -237.5,12.5
3D body: height 338.58, standoff 0, extent -362.5,-12.5 -337.5,12.5
3D body: height 98.43, standoff 11.81, extent -400,-50 -300,50
3D body: height 11.81, standoff 0, extent -400,-50 -300,-25
3D body: height 11.81, standoff 0, extent -400,25 -300,50
3D body: height 31.5, standoff 0, extent -362.5,-12.5 -337.5,12.5
3D body: height 338.58, standoff 0, extent -462.5,-12.5 -437.5,12.5
3D body: height 98.43, standoff 11.81, extent -500,-50 -400,50
3D body: height 11.81, standoff 0, extent -500,-50 -400,-25
3D body: height 11.81, standoff 0, extent -500,25 -400,50
3D body: height 31.5, standoff 0, extent -462.5,-12.5 -437.5,12.5
3D body: height 338.58, standoff 0, extent -562.5,-12.5 -537.5,12.5
3D body: height 98.43, standoff 11.81, extent -600,-50 -500,50
3D body: height 11.81, standoff 0, extent -600,-50 -500,-25
3D body: height 11.81, standoff 0, extent -600,25 -500,50
3D body: height 31.5, standoff 0, extent -562.5,-12.5 -537.5,12.5
3D body: height 338.58, standoff 0, extent -662.5,-12.5 -637.5,12.5
3D body: height 98.43, standoff 11.81, extent -700,-50 -600,50
3D body: height 11.81, standoff 0, extent -700,-50 -600,-25
3D body: height 11.81, standoff 0, extent -700,25 -600,50
3D body: height 31.5, standoff 0, extent -662.5,-12.5 -637.5,12.5
3D body: height 338.58, standoff 0, extent -762.5,-12.5 -737.5,12.5
3D body: height 98.43, standoff 11.81, extent -800,-50 -700,50
3D body: height 11.81, standoff 0, extent -800,-50 -700,-25
3D body: height 11.81, standoff 0, extent -800,25 -700,50
3D body: height 31.5, standoff 0, extent -762.5,-12.5 -737.5,12.5
3D body: height 338.58, standoff 0, extent -862.5,-12.5 -837.5,12.5
3D body: height 98.43, standoff 11.81, extent -900,-50 -800,50
3D body: height 11.81, standoff 0, extent -900,-50 -800,-25
3D body: height 11.81, standoff 0, extent -900,25 -800,50
3D body: height 31.5, standoff 0, extent -862.5,-12.5 -837.5,12.5
3D body: height 338.58, standoff 0, extent 837.5,-12.5 862.5,12.5
3D body: height 98.43, standoff 11.81, extent 800,-50 900,50
3D body: height 11.81, standoff 0, extent 800,-50 900,-25
3D body: height 11.81, standoff 0, extent 800,25 900,50
3D body: height 31.5, standoff 0, extent 837.5,-12.5 862.5,12.5
3D body: height 338.58, standoff 0, extent 737.5,-12.5 762.5,12.5
3D body: height 98.43, standoff 11.81, extent 700,-50 800,50
3D body: height 11.81, standoff 0, extent 700,-50 800,-25
3D body: height 11.81, standoff 0, extent 700,25 800,50
3D body: height 31.5, standoff 0, extent 737.5,-12.5 762.5,12.5
3D body: height 338.58, standoff 0, extent 637.5,-12.5 662.5,12.5
3D body: height 98.43, standoff 11.81, extent 600,-50 700,50
3D body: height 11.81, standoff 0, extent 600,-50 700,-25
3D body: height 11.81, standoff 0, extent 600,25 700,50
3D body: height 31.5, standoff 0, extent 637.5,-12.5 662.5,12.5
3D body: height 338.58, standoff 0, extent 537.5,-12.5 562.5,12.5
3D body: height 98.43, standoff 11.81, extent 500,-50 600,50
3D body: height 11.81, standoff 0, extent 500,-50 600,-25
3D body: height 11.81, standoff 0, extent 500,25 600,50
3D body: height 31.5, standoff 0, extent 537.5,-12.5 562.5,12.5
3D body: height 338.58, standoff 0, extent 437.5,-12.5 462.5,12.5
3D body: height 98.43, standoff 11.81, extent 400,-50 500,50
3D body: height 11.81, standoff 0, extent 400,-50 500,-25
3D body: height 11.81, standoff 0, extent 400,25 500,50
3D body: height 31.5, standoff 0, extent 437.5,-12.5 462.5,12.5